# Altium integrated library Mercury.IntLib: 6 symbols
Pins are listed as number, name and electrical type; pins without a type are passive.

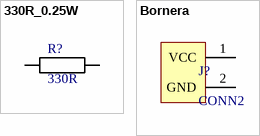
[diagram p0: symbols 330R_0.25W to Bornera]

## 330R_0.25W
designator R?, comment 330R
X
footprint 330R_8mil_0.25m
pins: 1, 2

## Bornera
designator J?, comment CONN2
footprint CONN2
pins: 1 VCC, 2 GND


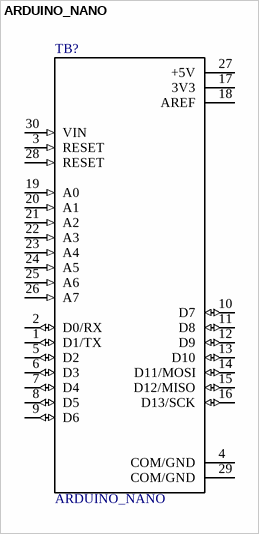
[diagram p1: symbol ARDUINO_NANO]

## ARDUINO_NANO
designator TB?
/ ATmega328 Arduino Nano AVRÂ® ATmega AVR MCU 8-Bit Embedded Evaluation Board /; Package: None; MP: ARDUINO NANO; SnapEDA_Link: https://www.snapeda.com/parts/ARDUINO%20NANO/Arduino/view-part/1128261/?ref=snap; Availability: Unavailable; Price: None; MF: Arduino; Value: *
footprint *SHIELD_ARDUINO_NANO
pins: 1 D1/TX (io), 2 D0/RX (io), 3 RESET (in), 4 COM/GND (power), 5 D2 (io), 6 D3 (io), 7 D4 (io), 8 D5 (io), 9 D6 (io), 10 D7 (io), 11 D8 (io), 12 D9 (io), 13 D10 (io), 14 D11/MOSI (io), 15 D12/MISO (io), 16 D13/SCK (io), 17 3V3 (power), 18 AREF (power), 19 A0 (in), 20 A1 (in), 21 A2 (in), 22 A3 (in), 23 A4 (in), 24 A5 (in), 25 A6 (in), 26 A7 (in), 27 +5V (power), 28 RESET (in), 29 COM/GND (power), 30 VIN (in)


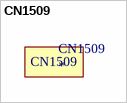
[diagram p2: symbol CN1509]

## CN1509
designator CN1509
footprint cn1509


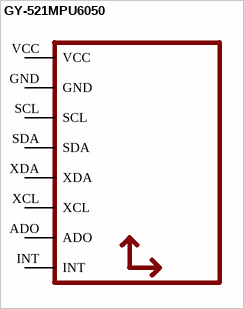
[diagram p3: symbol GY-521MPU6050]

## GY-521MPU6050
designator U?
GateName_1: G$1; SymbolName_1: MPU6050; DeviceSetName: GY-521; DeviceName: MPU6050; LibraryName: gy-521; Package: GY-521
footprint GY-521
pins: ADO, GND, INT, SCL, SDA, VCC, XCL, XDA


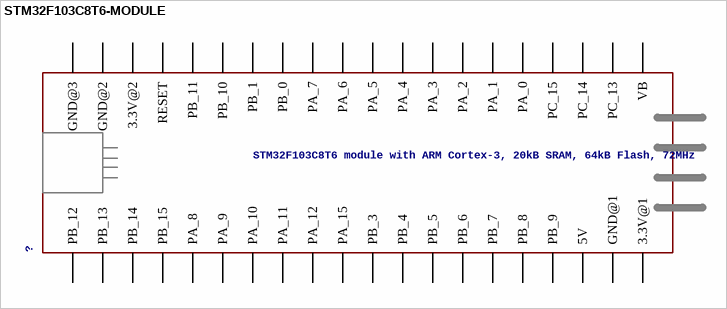
[diagram p4: symbol STM32F103C8T6-MODULE]

## STM32F103C8T6-MODULE
designator ?, comment STM32F103C8T6 module with ARM Cortex-3, 20kB SRAM, 64kB Flash, 72MHz
GateName_1: G$1; SymbolName_1: STM32F103C8T6-MODULE; LibraryName: stm32f103c8t6_module; DeviceSetName: STM32F103C8T6-MODULE; Package: STM32F103C8T6-MODULE
footprint STM32F103C8T6-MODULE
pins: 3.3V_1 3.3V@1, 3.3V_2 3.3V@2, 5V, GND_1 GND@1, GND_2 GND@2, GND_3 GND@3 (power), PA_0, PA_1, PA_2, PA_3, PA_4, PA_5, PA_6, PA_7, PA_8, PA_9, PA_10, PA_11, PA_12, PA_15, PB_0, PB_1, PB_3, PB_4, PB_5, PB_6, PB_7, PB_8, PB_9, PB_10, PB_11, PB_12, PB_13, PB_14, PB_15, PC_13, PC_14, PC_15, RESET, VB